# Altium schematic symbol library Minh_Lib.SchLib: 619 symbols (part 2 of 4) (continued)
## EEE-1CA100SR
designator EEE?  Supplier Part Number 1: 5369859
10uF 16 V dc Aluminium Electrolytic Capacitor; VS Series 2000h 4 (Dia.) x 5.4mm; Manufacturer: Panasonic; Manufacturer Part Number: EEE-1CA100SR; Tolerance: 20%; Voltage Rating: 16V; Ripple Current: 28mA; Life (Hours): 2000Hour; Polarity: Polar; Leakage Current: 3uA; Lead Length: 1.8mm; Supplier 1: RSComponents; RoHS: Yes; Category: Aluminum Electrolytic Capacitors; Stock 1: 3; Pricing 1: 5=0.33500, 50=0.19900, 100=0.17500, 500=0.10500, 1000=0.08900, 5=0.24200, 50=0.14400, 100=0.12600, 500=0.07600, 1000=0.06400 (USD); Mount: Surface Mount,PCB; Case/Package: Radial; Number of Pins: 2; Dielectric Material: Aluminium; Contact Plating: Tin; Min Operating Temperature: -40°C; Max Operating Temperature: 85°C; Capacitance: 10uF; Packaging: Tape and Reel; Voltage Rating (DC): 16V; Package Quantity: 2000; Ripple Current (AC): 28mA; Termination: SMD/SMT; Voltage: 16V; Series: S; Construction: Cylindrical; Diameter: 4mm; Length: 5.5mm; Width: 4.3mm; Height: 5.4mm; Height - Seated (Max): 0.213inch; Lead Pitch: 1mm; Radiation Hardening: No; REACH SVHC: No SVHC; Lead Free: Lead Free; RoHS Compliant: Yes; ComponentLink1URL: https://datasheet.ciiva.com/19458/1355487-19458346.pdf?src-supplier=Jameco; ComponentLink1Description: https://datasheet.ciiva.com/19458/1355487-19458346.pdf?src-supplier=Jameco; ComponentLink2URL: https://datasheet.ciiva.com/11784/0900766b8078636e-11784608.pdf?src-supplier=RSComponents; ComponentLink2Description: https://datasheet.ciiva.com/11784/0900766b8078636e-11784608.pdf?src-supplier=RSComponents; ComponentLink3URL: https://datasheet.ciiva.com/14589/70255710-14589897.pdf?src-supplier=Allied+Electronics; ComponentLink3Description: https://datasheet.ciiva.com/14589/70255710-14589897.pdf?src-supplier=Allied+Electronics; ComponentLink4URL: https://datasheet.ciiva.com/14603/70255710-14603768.pdf?src-supplier=Allied+Electronics; ComponentLink4Description: https://datasheet.ciiva.com/14603/70255710-14603768.pdf?src-supplier=Allied+Electronics; ComponentLink5URL: https://datasheet.ciiva.com/14607/70255710-14607567.pdf?src-supplier=Allied+Electronics; ComponentLink5Description: https://datasheet.ciiva.com/14607/70255710-14607567.pdf?src-supplier=Allied+Electronics; ComponentLink6URL: https://datasheet.ciiva.com/43485/aba0000ce2-43485607.pdf?src-supplier=Farnell; ComponentLink6Description: https://datasheet.ciiva.com/43485/aba0000ce2-43485607.pdf?src-supplier=Farnell; ComponentLink7URL: https://datasheet.ciiva.com/46388/aba0000ce2-46388105.pdf?src-supplier=Element14; ComponentLink7Description: https://datasheet.ciiva.com/46388/aba0000ce2-46388105.pdf?src-supplier=Element14; ComponentLink8URL: https://datasheet.ciiva.com/6121/aba0000ce2-6121341.pdf?src-supplier=Farnell; ComponentLink8Description: https://datasheet.ciiva.com/6121/aba0000ce2-6121341.pdf?src-supplier=Farnell; ComponentLink9URL: https://datasheet.ciiva.com/46435/aba0000ce2-46435189.pdf?src-supplier=Element14; ComponentLink9Description: https://datasheet.ciiva.com/46435/aba0000ce2-46435189.pdf?src-supplier=Element14; ComponentLink10URL: https://datasheet.ciiva.com/11681/aba0000ce2-11681100.pdf?src-supplier=Avnet; ComponentLink10Description: https://datasheet.ciiva.com/11681/aba0000ce2-11681100.pdf?src-supplier=Avnet; ComponentLink11URL: https://datasheet.ciiva.com/16508/aba0000ce2-16508470.pdf?src-supplier=Future+Electronics; ComponentLink11Description: https://datasheet.ciiva.com/16508/aba0000ce2-16508470.pdf?src-supplier=Future+Electronics; ComponentLink12URL: https://datasheet.ciiva.com/2983/aba0000ce2-2983908.pdf?src-supplier=Avnet; ComponentLink12Description: https://datasheet.ciiva.com/2983/aba0000ce2-2983908.pdf?src-supplier=Avnet; ComponentLink13URL: https://datasheet.ciiva.com/30164/11aba0000ce2-30164062.pdf?src-supplier=Onlinecomponents.com; ComponentLink13Description: https://datasheet.ciiva.com/30164/11aba0000ce2-30164062.pdf?src-supplier=Onlinecomponents.com; ComponentLink14URL: https://datasheet.ciiva.com/17353/aba0000ce2-17353304.pdf?src-supplier=Avnet+Europe; ComponentLink14Description: https://datasheet.ciiva.com/17353/aba0000ce2-17353304.pdf?src-supplier=Avnet+Europe
footprint CAPACITOR/ALU - SIZE B/SMD - 4X5.4 (CAPACITOR  -  ALUMINIUM - SIZE B / EEEFK - SMD)
pins: 1, 2
text: +

## EEE-1CA101P
designator EEE?  Supplier Part Number 1: 6283986
Cap Aluminum 100uF 16V 20% (8 X 6.2mm) SMD 200mA 2000 hr 85°C T/R; Manufacturer: Panasonic; Manufacturer Part Number: EEE-1CA101P; Life (Hours): 2000Hour; Leakage Current: 3uA; Dissipation Factor: 0.2%; Supplier 1: RSComponents; RoHS: Yes; Category: Aluminum Electrolytic Capacitors; Stock 1: 750; Pricing 1: 5=0.52100, 25=0.37100, 375=0.24700, 1250=0.13900, 5=0.37600, 25=0.26800, 375=0.17800, 1250=0.10000 (USD); Mount: Surface Mount,PCB; Case/Package: Radial; Min Operating Temperature: -40°C; Max Operating Temperature: 85°C; Capacitance: 100uF; Tolerance: 20%; Voltage Rating: 16V; Packaging: Tape and Reel; Ripple Current (AC): 200mA; Ripple Current: 200mA; Voltage Rating (DC): 16V; Package Quantity: 1; Termination: SMD/SMT; Voltage: 16V; Series: S; Construction: Cylindrical; Diameter: 8mm; Length: 6.2mm; Height: 6.2mm; Height - Seated (Max): 0.244inch; Radiation Hardening: No; REACH SVHC: No SVHC; Lead Free: Lead Free; RoHS Compliant: Yes; ComponentLink1URL: https://datasheet.ciiva.com/11780/0900766b808a016a-11780833.pdf?src-supplier=RSComponents; ComponentLink1Description: https://datasheet.ciiva.com/11780/0900766b808a016a-11780833.pdf?src-supplier=RSComponents; ComponentLink2URL: https://datasheet.ciiva.com/24071/aba0000ce2-40801-24071494.pdf?src-supplier=Mouser; ComponentLink2Description: https://datasheet.ciiva.com/24071/aba0000ce2-40801-24071494.pdf?src-supplier=Mouser; ComponentLink3URL: https://datasheet.ciiva.com/14598/70255710-14598917.pdf?src-supplier=Allied+Electronics; ComponentLink3Description: https://datasheet.ciiva.com/14598/70255710-14598917.pdf?src-supplier=Allied+Electronics; ComponentLink4URL: https://datasheet.ciiva.com/11680/aba0000ce2-11680254.pdf?src-supplier=Avnet; ComponentLink4Description: https://datasheet.ciiva.com/11680/aba0000ce2-11680254.pdf?src-supplier=Avnet; ComponentLink5URL: https://datasheet.ciiva.com/16507/aba0000ce2-16507557.pdf?src-supplier=Future+Electronics; ComponentLink5Description: https://datasheet.ciiva.com/16507/aba0000ce2-16507557.pdf?src-supplier=Future+Electronics; ComponentLink6URL: https://datasheet.ciiva.com/2985/aba0000ce2-2985069.pdf?src-supplier=Avnet; ComponentLink6Description: https://datasheet.ciiva.com/2985/aba0000ce2-2985069.pdf?src-supplier=Avnet; ComponentLink7URL: https://datasheet.ciiva.com/30213/11aba0000ce2-30213446.pdf?src-supplier=Onlinecomponents.com; ComponentLink7Description: https://datasheet.ciiva.com/30213/11aba0000ce2-30213446.pdf?src-supplier=Onlinecomponents.com; ComponentLink8URL: https://datasheet.ciiva.com/17353/aba0000ce2-17353306.pdf?src-supplier=Avnet+Europe; ComponentLink8Description: https://datasheet.ciiva.com/17353/aba0000ce2-17353306.pdf?src-supplier=Avnet+Europe
footprint CAPACITOR/ALU - SIZE E/SMD - 8X6.2 (CAPACITOR  -  ALUMINIUM - SIZE E / EEEFK - SMD)
pins: 1, 2
text: +

## EEE-1CA101WP
designator EEE?  Supplier Part Number 1: PCE3880CT-ND
Cap Aluminum 100uF 16V 20% (6.3 X 5.4mm) SMD 70mA 1000 hr 85°C T/R; Manufacturer: Panasonic; Manufacturer Part Number: EEE-1CA101WP; Life (Hours): 1000Hour; Leakage Current: 3uA; Supplier 1: Digi-Key; RoHS: Yes; Category: Aluminum Electrolytic Capacitors; Pricing 1: 1=0.45000, 10=0.31200, 50=0.21860, 100=0.18730, 500=0.14050 (USD); Mount: Surface Mount,PCB; Case/Package: Radial; Contact Plating: Tin; Min Operating Temperature: -40°C; Max Operating Temperature: 85°C; Capacitance: 100uF; Tolerance: 20%; Voltage Rating: 16V; Ripple Current: 70mA; Voltage Rating (DC): 16V; Packaging: Tape and Reel; Package Quantity: 1000; Termination: SMD/SMT; Ripple Current (AC): 70mA; Voltage: 16V; Series: S; Construction: Cylindrical; Diameter: 6.3mm; Length: 5.5mm; Height: 5.4mm; Height - Seated (Max): 0.213inch; Radiation Hardening: No; Lead Free: Lead Free; RoHS Compliant: Yes; REACH SVHC: Unknown; ComponentLink1URL: https://datasheet.ciiva.com/36525/1355583-36525976.pdf?src-supplier=Jameco; ComponentLink1Description: https://datasheet.ciiva.com/36525/1355583-36525976.pdf?src-supplier=Jameco; ComponentLink2URL: https://datasheet.ciiva.com/24022/aba0000ce2-40801-24022853.pdf?src-supplier=Mouser; ComponentLink2Description: https://datasheet.ciiva.com/24022/aba0000ce2-40801-24022853.pdf?src-supplier=Mouser; ComponentLink3URL: https://datasheet.ciiva.com/14600/70255710-14600124.pdf?src-supplier=Allied+Electronics; ComponentLink3Description: https://datasheet.ciiva.com/14600/70255710-14600124.pdf?src-supplier=Allied+Electronics; ComponentLink4URL: https://datasheet.ciiva.com/11680/aba0000ce2-11680765.pdf?src-supplier=Avnet; ComponentLink4Description: https://datasheet.ciiva.com/11680/aba0000ce2-11680765.pdf?src-supplier=Avnet; ComponentLink5URL: https://datasheet.ciiva.com/2983/aba0000ce2-2983909.pdf?src-supplier=Avnet; ComponentLink5Description: https://datasheet.ciiva.com/2983/aba0000ce2-2983909.pdf?src-supplier=Avnet; ComponentLink6URL: https://datasheet.ciiva.com/30194/11aba0000ce2-30194491.pdf?src-supplier=Onlinecomponents.com; ComponentLink6Description: https://datasheet.ciiva.com/30194/11aba0000ce2-30194491.pdf?src-supplier=Onlinecomponents.com; ComponentLink7URL: https://datasheet.ciiva.com/17353/aba0000ce2-17353308.pdf?src-supplier=Avnet+Europe; ComponentLink7Description: https://datasheet.ciiva.com/17353/aba0000ce2-17353308.pdf?src-supplier=Avnet+Europe
footprint CAPACITOR/ALU - SIZE D/SMD - 6.3X5.4 (CAPACITOR  -  ALUMINIUM - SIZE D / EEEFK - SMD)
pins: 1, 2
text: +

## EEE-1CA220SR
designator EEE?  Supplier Part Number 1: 5369865
Aluminum Electrolytic Capacitor, 2000h 5 (Dia) x 5.4mm, 22uF 16 VDC, VS Series; Manufacturer: Panasonic; Manufacturer Part Number: EEE-1CA220SR; Dielectric Material: Aluminium; Voltage Rating: 16V; Ripple Current (AC): 39mA; Tolerance: 20%; Life (Hours): 2000Hour; Leakage Current: 3uA; Lead Length: 2.2mm; Supplier 1: RSComponents; RoHS: Yes; Category: Aluminum Electrolytic Capacitors; Stock 1: 255; Pricing 1: 5=0.34100, 25=0.33800, 375=0.15800, 1250=0.07500, 5=0.24600, 25=0.24400, 375=0.11400, 1250=0.05400 (USD); Mount: Surface Mount,PCB; Case/Package: Radial; Number of Pins: 2; Min Operating Temperature: -40°C; Max Operating Temperature: 85°C; Capacitance: 22uF; Packaging: Tape and Reel; Voltage Rating (DC): 16V; Ripple Current: 39mA; Package Quantity: 1; Termination: SMD/SMT; Voltage: 16V; Series: S; Construction: Cylindrical; Diameter: 5mm; Length: 5.5mm; Width: 5.3mm; Height: 5.4mm; Height - Seated (Max): 0.213inch; Lead Pitch: 1.5mm; Radiation Hardening: No; REACH SVHC: No SVHC; Lead Free: Lead Free; RoHS Compliant: Yes; ComponentLink1URL: https://datasheet.ciiva.com/11779/0900766b8078636e-11779629.pdf?src-supplier=RSComponents; ComponentLink1Description: https://datasheet.ciiva.com/11779/0900766b8078636e-11779629.pdf?src-supplier=RSComponents; ComponentLink2URL: https://datasheet.ciiva.com/24026/aba0000ce2-40801-24026071.pdf?src-supplier=Mouser; ComponentLink2Description: https://datasheet.ciiva.com/24026/aba0000ce2-40801-24026071.pdf?src-supplier=Mouser; ComponentLink3URL: https://datasheet.ciiva.com/14604/70255710-14604313.pdf?src-supplier=Allied+Electronics; ComponentLink3Description: https://datasheet.ciiva.com/14604/70255710-14604313.pdf?src-supplier=Allied+Electronics; ComponentLink4URL: https://datasheet.ciiva.com/14606/70255710-14606093.pdf?src-supplier=Allied+Electronics; ComponentLink4Description: https://datasheet.ciiva.com/14606/70255710-14606093.pdf?src-supplier=Allied+Electronics; ComponentLink5URL: https://datasheet.ciiva.com/43485/aba0000ce2-43485608.pdf?src-supplier=Farnell; ComponentLink5Description: https://datasheet.ciiva.com/43485/aba0000ce2-43485608.pdf?src-supplier=Farnell; ComponentLink6URL: https://datasheet.ciiva.com/6085/aba0000ce2-6085101.pdf?src-supplier=Farnell; ComponentLink6Description: https://datasheet.ciiva.com/6085/aba0000ce2-6085101.pdf?src-supplier=Farnell; ComponentLink7URL: https://datasheet.ciiva.com/2985/aba0000ce2-2985074.pdf?src-supplier=Avnet; ComponentLink7Description: https://datasheet.ciiva.com/2985/aba0000ce2-2985074.pdf?src-supplier=Avnet; ComponentLink8URL: https://datasheet.ciiva.com/16432/aba0000ce2-16432906.pdf?src-supplier=Future+Electronics; ComponentLink8Description: https://datasheet.ciiva.com/16432/aba0000ce2-16432906.pdf?src-supplier=Future+Electronics; ComponentLink9URL: https://datasheet.ciiva.com/2985/aba0000ce2-2985075.pdf?src-supplier=Avnet; ComponentLink9Description: https://datasheet.ciiva.com/2985/aba0000ce2-2985075.pdf?src-supplier=Avnet; ComponentLink10URL: https://datasheet.ciiva.com/30061/11aba0000ce2-30061845.pdf?src-supplier=Onlinecomponents.com; ComponentLink10Description: https://datasheet.ciiva.com/30061/11aba0000ce2-30061845.pdf?src-supplier=Onlinecomponents.com
footprint CAPACITOR/ALU - SIZE C/SMD - 5X5.4 (CAPACITOR  -  ALUMINIUM - SIZE C / EEEFK - SMD)
pins: 1, 2
text: +

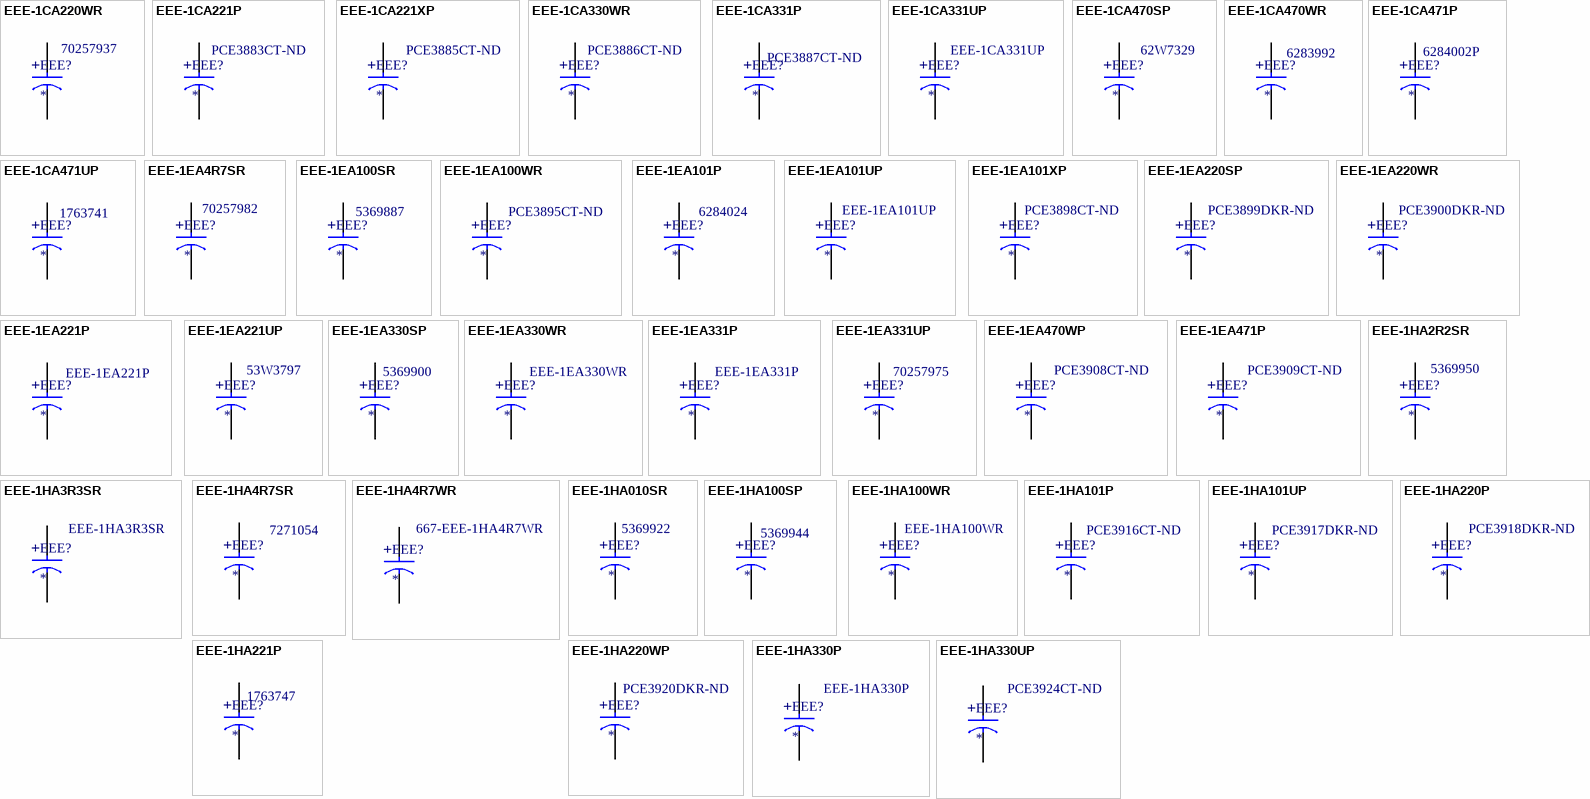
[diagram p8: symbols EEE-1CA220WR to EEE-1HA330UP]

## EEE-1CA220WR
designator EEE?  Supplier Part Number 1: 70257937
Cap Aluminum 22uF 16V 20% (4 X 5.4mm) SMD 28mA 1000h 85 C T/R; Manufacturer: Panasonic; Manufacturer Part Number: EEE-1CA220WR; Polarity: Polar; Life (Hours): 1000Hour; Leakage Current: 3uA; Supplier 1: Allied Electronics; RoHS: Yes; Category: Aluminum Electrolytic Capacitors; Stock 1: 30; Pricing 1: 100=0.14600, 200=0.14300, 500=0.13900, 1000=0.13200, 2500=0.12400, 5000=0.11400, 10000=0.10200 (USD); Mount: Surface Mount,PCB; Case/Package: Radial; Contact Plating: Tin; Min Operating Temperature: -40°C; Max Operating Temperature: 85°C; Capacitance: 22uF; Tolerance: 20%; Voltage Rating: 16V; Packaging: Tape and Reel; Ripple Current (AC): 28mA; Ripple Current: 28mA; Voltage Rating (DC): 16V; Package Quantity: 2000; Termination: SMD/SMT; Voltage: 16V; Series: S; Construction: Cylindrical; Diameter: 4mm; Length: 5.5mm; Height: 5.4mm; Height - Seated (Max): 0.213inch; Radiation Hardening: No; REACH SVHC: Unknown; Lead Free: Lead Free; RoHS Compliant: Yes; ComponentLink1URL: https://datasheet.ciiva.com/24023/aba0000ce2-40801-24023653.pdf?src-supplier=Mouser; ComponentLink1Description: https://datasheet.ciiva.com/24023/aba0000ce2-40801-24023653.pdf?src-supplier=Mouser; ComponentLink2URL: https://datasheet.ciiva.com/14592/70255710-14592571.pdf?src-supplier=Allied+Electronics; ComponentLink2Description: https://datasheet.ciiva.com/14592/70255710-14592571.pdf?src-supplier=Allied+Electronics; ComponentLink3URL: https://datasheet.ciiva.com/11673/aba0000ce2-11673883.pdf?src-supplier=Avnet; ComponentLink3Description: https://datasheet.ciiva.com/11673/aba0000ce2-11673883.pdf?src-supplier=Avnet; ComponentLink4URL: https://datasheet.ciiva.com/2983/aba0000ce2-2983910.pdf?src-supplier=Avnet; ComponentLink4Description: https://datasheet.ciiva.com/2983/aba0000ce2-2983910.pdf?src-supplier=Avnet; ComponentLink5URL: https://datasheet.ciiva.com/30227/11aba0000ce2-30227839.pdf?src-supplier=Onlinecomponents.com; ComponentLink5Description: https://datasheet.ciiva.com/30227/11aba0000ce2-30227839.pdf?src-supplier=Onlinecomponents.com; ComponentLink6URL: https://datasheet.ciiva.com/17536/aba0000ce2-17536751.pdf?src-supplier=Avnet+Europe; ComponentLink6Description: https://datasheet.ciiva.com/17536/aba0000ce2-17536751.pdf?src-supplier=Avnet+Europe
footprint CAPACITOR/ALU - SIZE B/SMD - 4X5.4 (CAPACITOR  -  ALUMINIUM - SIZE B / EEEFK - SMD)
pins: 1, 2
text: +

## EEE-1CA221P
designator EEE?  Supplier Part Number 1: PCE3883CT-ND
Cap Aluminum 220uF 16V 20% (8 X 10.2mm) SMD 280mA 2000h 85°C T/R; Manufacturer: Panasonic; Manufacturer Part Number: EEE-1CA221P; Life (Hours): 2000Hour; Leakage Current: 3uA; Supplier 1: Digi-Key; RoHS: Yes; Category: Aluminum Electrolytic Capacitors; Stock 1: 191; Pricing 1: 1=0.65000, 10=0.46000, 50=0.34760, 100=0.30270 (USD); Mount: Surface Mount,PCB; Case/Package: Radial; Contact Plating: Tin; Min Operating Temperature: -40°C; Max Operating Temperature: 85°C; Capacitance: 220uF; Tolerance: 20%; Ripple Current: 280mA; Packaging: Tape and Reel; Voltage Rating: 16V; Ripple Current (AC): 280mA; Voltage Rating (DC): 16V; Package Quantity: 1; Termination: SMD/SMT; Voltage: 16V; Series: S; Construction: Cylindrical; Diameter: 8mm; Length: 10.5mm; Height: 10.2mm; Height - Seated (Max): 0.402inch; Radiation Hardening: No; REACH SVHC: No SVHC; Lead Free: Lead Free; RoHS Compliant: Yes; ComponentLink1URL: https://datasheet.ciiva.com/24070/aba0000ce2-40801-24070414.pdf?src-supplier=Mouser; ComponentLink1Description: https://datasheet.ciiva.com/24070/aba0000ce2-40801-24070414.pdf?src-supplier=Mouser; ComponentLink2URL: https://datasheet.ciiva.com/14593/70255710-14593371.pdf?src-supplier=Allied+Electronics; ComponentLink2Description: https://datasheet.ciiva.com/14593/70255710-14593371.pdf?src-supplier=Allied+Electronics; ComponentLink3URL: https://datasheet.ciiva.com/2985/aba0000ce2-2985078.pdf?src-supplier=Avnet; ComponentLink3Description: https://datasheet.ciiva.com/2985/aba0000ce2-2985078.pdf?src-supplier=Avnet; ComponentLink4URL: https://datasheet.ciiva.com/30265/11aba0000ce2-30265224.pdf?src-supplier=Onlinecomponents.com; ComponentLink4Description: https://datasheet.ciiva.com/30265/11aba0000ce2-30265224.pdf?src-supplier=Onlinecomponents.com; ComponentLink5URL: https://datasheet.ciiva.com/15165/getdatasheetpartid-33945-15165629.pdf?src-supplier=Verical; ComponentLink5Description: https://datasheet.ciiva.com/15165/getdatasheetpartid-33945-15165629.pdf?src-supplier=Verical
footprint CAPACITOR/ALU - SIZE F/SMD - 8X10.2 (CAPACITOR  -  ALUMINIUM - SIZE F / EEEFK - SMD)
pins: 1, 2
text: +

## EEE-1CA221XP
designator EEE?  Supplier Part Number 1: PCE3885CT-ND
Cap Aluminum 220uF 16V 20% (6.3 X 7.7mm) SMD 162mA 2000h 85°C T/R; Manufacturer: Panasonic; Manufacturer Part Number: EEE-1CA221XP; Dielectric Material: Aluminium; Polarity: Polar; Life (Hours): 2000Hour; Leakage Current: 35.2uA; Supplier 1: Digi-Key; RoHS: Yes; Category: Aluminum Electrolytic Capacitors; Pricing 1: 1=0.52000, 10=0.36100, 50=0.25240, 100=0.21630 (USD); Mount: Surface Mount,PCB; Case/Package: Radial; Contact Plating: Tin; Min Operating Temperature: -40°C; Max Operating Temperature: 85°C; Capacitance: 220uF; Tolerance: 20%; Voltage Rating: 16V; Ripple Current: 162mA; Voltage Rating (DC): 16V; Packaging: Tape and Reel; Package Quantity: 900; Ripple Current (AC): 162mA; Termination: SMD/SMT; Voltage: 16V; Series: S; Construction: Cylindrical; Diameter: 6.3mm; Length: 8mm; Height: 7.7mm; Height - Seated (Max): 0.303inch; Radiation Hardening: No; REACH SVHC: No SVHC; Lead Free: Lead Free; RoHS Compliant: Yes; ComponentLink1URL: https://datasheet.ciiva.com/43470/aba0000ce2-43470637.pdf?src-supplier=Farnell; ComponentLink1Description: https://datasheet.ciiva.com/43470/aba0000ce2-43470637.pdf?src-supplier=Farnell; ComponentLink2URL: https://datasheet.ciiva.com/46378/aba0000ce2-46378312.pdf?src-supplier=Element14; ComponentLink2Description: https://datasheet.ciiva.com/46378/aba0000ce2-46378312.pdf?src-supplier=Element14; ComponentLink3URL: https://datasheet.ciiva.com/31414/aba0000ce2-31414645.pdf?src-supplier=Farnell; ComponentLink3Description: https://datasheet.ciiva.com/31414/aba0000ce2-31414645.pdf?src-supplier=Farnell; ComponentLink4URL: https://datasheet.ciiva.com/46374/aba0000ce2-46374334.pdf?src-supplier=Element14; ComponentLink4Description: https://datasheet.ciiva.com/46374/aba0000ce2-46374334.pdf?src-supplier=Element14; ComponentLink5URL: https://datasheet.ciiva.com/14603/70255710-14603806.pdf?src-supplier=Allied+Electronics; ComponentLink5Description: https://datasheet.ciiva.com/14603/70255710-14603806.pdf?src-supplier=Allied+Electronics; ComponentLink6URL: https://datasheet.ciiva.com/14597/70255710-14597237.pdf?src-supplier=Allied+Electronics; ComponentLink6Description: https://datasheet.ciiva.com/14597/70255710-14597237.pdf?src-supplier=Allied+Electronics; ComponentLink7URL: https://datasheet.ciiva.com/11673/aba0000ce2-11673884.pdf?src-supplier=Avnet; ComponentLink7Description: https://datasheet.ciiva.com/11673/aba0000ce2-11673884.pdf?src-supplier=Avnet; ComponentLink8URL: https://datasheet.ciiva.com/16200/aba0000ce2-16200885.pdf?src-supplier=Future+Electronics; ComponentLink8Description: https://datasheet.ciiva.com/16200/aba0000ce2-16200885.pdf?src-supplier=Future+Electronics; ComponentLink9URL: https://datasheet.ciiva.com/16539/aba0000ce2-16539935.pdf?src-supplier=Avnet+Asia; ComponentLink9Description: https://datasheet.ciiva.com/16539/aba0000ce2-16539935.pdf?src-supplier=Avnet+Asia
footprint CAPACITOR/ALU - SIZE D8/SMD - 6.3X7.7 (CAPACITOR  -  ALUMINIUM - SIZE D8 / EEEFK - SMD)
pins: 1, 2
text: +

## EEE-1CA330WR
designator EEE?  Supplier Part Number 1: PCE3886CT-ND
Cap Aluminum 33uF 16V 20% (5 X 5.4mm) SMD 35mA 1000 hr 85°C T/R; Manufacturer: Panasonic; Manufacturer Part Number: EEE-1CA330WR; Life (Hours): 1000Hour; Supplier 1: Digi-Key; RoHS: Yes; Category: Aluminum Electrolytic Capacitors; Stock 1: 8; Pricing 1: 1=0.35000, 10=0.24400, 50=0.17060, 100=0.14630, 500=0.10972 (USD); Mount: Surface Mount,PCB; Case/Package: Radial; Min Operating Temperature: -40°C; Max Operating Temperature: 85°C; Capacitance: 33uF; Voltage Rating: 16V; Tolerance: 20%; Ripple Current: 35mA; Packaging: Tape and Reel; Package Quantity: 1; Ripple Current (AC): 35mA; Voltage Rating (DC): 16V; Termination: SMD/SMT; Series: S; Construction: Cylindrical; Diameter: 5mm; Length: 5.5mm; Height: 5.4mm; Height - Seated (Max): 0.213inch; Radiation Hardening: No; REACH SVHC: No SVHC; Lead Free: Lead Free; RoHS Compliant: Yes; ComponentLink1URL: https://datasheet.ciiva.com/16388/aba0000ce2-16388678.pdf?src-supplier=Future+Electronics; ComponentLink1Description: https://datasheet.ciiva.com/16388/aba0000ce2-16388678.pdf?src-supplier=Future+Electronics; ComponentLink2URL: https://datasheet.ciiva.com/31414/aba0000ce2-31414646.pdf?src-supplier=Farnell; ComponentLink2Description: https://datasheet.ciiva.com/31414/aba0000ce2-31414646.pdf?src-supplier=Farnell; ComponentLink3URL: https://datasheet.ciiva.com/46378/aba0000ce2-46378311.pdf?src-supplier=Element14; ComponentLink3Description: https://datasheet.ciiva.com/46378/aba0000ce2-46378311.pdf?src-supplier=Element14; ComponentLink4URL: https://datasheet.ciiva.com/30129/11aba0000ce2-30129770.pdf?src-supplier=Onlinecomponents.com; ComponentLink4Description: https://datasheet.ciiva.com/30129/11aba0000ce2-30129770.pdf?src-supplier=Onlinecomponents.com; ComponentLink5URL: https://datasheet.ciiva.com/14596/70255710-14596699.pdf?src-supplier=Allied+Electronics; ComponentLink5Description: https://datasheet.ciiva.com/14596/70255710-14596699.pdf?src-supplier=Allied+Electronics; ComponentLink6URL: https://datasheet.ciiva.com/46374/aba0000ce2-46374333.pdf?src-supplier=Element14; ComponentLink6Description: https://datasheet.ciiva.com/46374/aba0000ce2-46374333.pdf?src-supplier=Element14; ComponentLink7URL: https://datasheet.ciiva.com/2985/aba0000ce2-2985086.pdf?src-supplier=Avnet; ComponentLink7Description: https://datasheet.ciiva.com/2985/aba0000ce2-2985086.pdf?src-supplier=Avnet; ComponentLink8URL: https://datasheet.ciiva.com/24027/aba0000ce2-40801-24027199.pdf?src-supplier=Mouser; ComponentLink8Description: https://datasheet.ciiva.com/24027/aba0000ce2-40801-24027199.pdf?src-supplier=Mouser; ComponentLink9URL: https://datasheet.ciiva.com/17536/aba0000ce2-17536604.pdf?src-supplier=Avnet+Europe; ComponentLink9Description: https://datasheet.ciiva.com/17536/aba0000ce2-17536604.pdf?src-supplier=Avnet+Europe; ComponentLink10URL: https://datasheet.ciiva.com/14602/70255710-14602350.pdf?src-supplier=Allied+Electronics; ComponentLink10Description: https://datasheet.ciiva.com/14602/70255710-14602350.pdf?src-supplier=Allied+Electronics; ComponentLink11URL: https://datasheet.ciiva.com/43470/aba0000ce2-43470638.pdf?src-supplier=Farnell; ComponentLink11Description: https://datasheet.ciiva.com/43470/aba0000ce2-43470638.pdf?src-supplier=Farnell
footprint CAPACITOR/ALU - SIZE C/SMD - 5X5.4 (CAPACITOR  -  ALUMINIUM - SIZE C / EEEFK - SMD)
pins: 1, 2
text: +

## EEE-1CA331P
designator EEE?  Supplier Part Number 1: PCE3887CT-ND
Cap Aluminum 330uF 16V 20% (10 X 10.2mm) SMD 380mA 2000 hr 85°C T/R; Manufacturer: Panasonic; Manufacturer Part Number: EEE-1CA331P; Life (Hours): 2000Hour; Leakage Current: 3uA; Supplier 1: Digi-Key; RoHS: Yes; Category: Aluminum Electrolytic Capacitors; Pricing 1: 1=0.76000, 10=0.53800, 50=0.40720, 100=0.35460 (USD); Mount: Surface Mount; Case/Package: Radial; Min Operating Temperature: -40°C; Max Operating Temperature: 85°C; Packaging: Tape and Reel; Capacitance: 330uF; Tolerance: 20%; Ripple Current: 380mA; Voltage Rating: 16V; Voltage Rating (DC): 16V; Package Quantity: 500; Termination: SMD/SMT; Series: S; Construction: Cylindrical; Ripple Current (AC): 380mA; Voltage: 16V; Diameter: 10mm; Length: 10.5mm; Height: 10.2mm; Height - Seated (Max): 0.402inch; Radiation Hardening: No; Lead Free: Lead Free; RoHS Compliant: Yes; REACH SVHC: Unknown; ComponentLink1URL: https://datasheet.ciiva.com/2985/aba0000ce2-2985088.pdf?src-supplier=Avnet; ComponentLink1Description: https://datasheet.ciiva.com/2985/aba0000ce2-2985088.pdf?src-supplier=Avnet; ComponentLink2URL: https://datasheet.ciiva.com/14610/70255710-14610587.pdf?src-supplier=Allied+Electronics; ComponentLink2Description: https://datasheet.ciiva.com/14610/70255710-14610587.pdf?src-supplier=Allied+Electronics; ComponentLink3URL: https://datasheet.ciiva.com/17534/aba0000ce2-17534507.pdf?src-supplier=Avnet+Europe; ComponentLink3Description: https://datasheet.ciiva.com/17534/aba0000ce2-17534507.pdf?src-supplier=Avnet+Europe; ComponentLink4URL: https://datasheet.ciiva.com/24069/aba0000ce2-40801-24069277.pdf?src-supplier=Mouser; ComponentLink4Description: https://datasheet.ciiva.com/24069/aba0000ce2-40801-24069277.pdf?src-supplier=Mouser; ComponentLink5URL: https://datasheet.ciiva.com/14593/70255710-14593503.pdf?src-supplier=Allied+Electronics; ComponentLink5Description: https://datasheet.ciiva.com/14593/70255710-14593503.pdf?src-supplier=Allied+Electronics
footprint CAPACITOR/ALU - SIZE G/SMD - 10X10.2 (CAPACITOR  -  ALUMINIUM - SIZE G / EEEFK - SMD)
pins: 1, 2
text: +

## EEE-1CA331UP
designator EEE?  Supplier Part Number 1: EEE-1CA331UP
Cap Aluminum 330uF 16V 20% (8 X 10.2mm) SMD 320mA 2000 hr 85°C T/R; Manufacturer: Panasonic; Dielectric Material: Aluminium; Life (Hours): 2000Hour; Leakage Current: 52.8uA; Supplier 1: Arrow Electronics; Manufacturer Part Number: EEE-1CA331UP; RoHS: Yes; Category: Aluminum Electrolytic Capacitors; Stock 1: 9; Pricing 1: 1=0.56020 (USD); Mount: Surface Mount,PCB; Case/Package: Radial; Contact Plating: Tin; Min Operating Temperature: -40°C; Max Operating Temperature: 85°C; Capacitance: 330uF; Voltage Rating: 16V; Tolerance: 20%; Ripple Current: 320mA; Packaging: Tape and Reel; Package Quantity: 1; Ripple Current (AC): 320mA; Voltage Rating (DC): 16V; Termination: SMD/SMT; Voltage: 16V; Series: S; Construction: Cylindrical; Diameter: 8mm; Length: 10.5mm; Height: 10.2mm; Height - Seated (Max): 0.402inch; Radiation Hardening: No; REACH SVHC: No SVHC; Lead Free: Lead Free; RoHS Compliant: Yes; ComponentLink1URL: https://datasheet.ciiva.com/43470/aba0000ce2-43470639.pdf?src-supplier=Farnell; ComponentLink1Description: https://datasheet.ciiva.com/43470/aba0000ce2-43470639.pdf?src-supplier=Farnell; ComponentLink2URL: https://datasheet.ciiva.com/46378/aba0000ce2-46378310.pdf?src-supplier=Element14; ComponentLink2Description: https://datasheet.ciiva.com/46378/aba0000ce2-46378310.pdf?src-supplier=Element14; ComponentLink3URL: https://datasheet.ciiva.com/31414/aba0000ce2-31414647.pdf?src-supplier=Farnell; ComponentLink3Description: https://datasheet.ciiva.com/31414/aba0000ce2-31414647.pdf?src-supplier=Farnell; ComponentLink4URL: https://datasheet.ciiva.com/46374/aba0000ce2-46374332.pdf?src-supplier=Element14; ComponentLink4Description: https://datasheet.ciiva.com/46374/aba0000ce2-46374332.pdf?src-supplier=Element14; ComponentLink5URL: https://datasheet.ciiva.com/14610/70255710-14610213.pdf?src-supplier=Allied+Electronics; ComponentLink5Description: https://datasheet.ciiva.com/14610/70255710-14610213.pdf?src-supplier=Allied+Electronics; ComponentLink6URL: https://datasheet.ciiva.com/2985/aba0000ce2-2985089.pdf?src-supplier=Avnet; ComponentLink6Description: https://datasheet.ciiva.com/2985/aba0000ce2-2985089.pdf?src-supplier=Avnet; ComponentLink7URL: https://datasheet.ciiva.com/16388/aba0000ce2-16388680.pdf?src-supplier=Future+Electronics; ComponentLink7Description: https://datasheet.ciiva.com/16388/aba0000ce2-16388680.pdf?src-supplier=Future+Electronics; ComponentLink8URL: https://datasheet.ciiva.com/15166/getdatasheetpartid-169248-15166139.pdf?src-supplier=Verical; ComponentLink8Description: https://datasheet.ciiva.com/15166/getdatasheetpartid-169248-15166139.pdf?src-supplier=Verical; ComponentLink9URL: https://datasheet.ciiva.com/30112/11aba0000ce2-30112718.pdf?src-supplier=Onlinecomponents.com; ComponentLink9Description: https://datasheet.ciiva.com/30112/11aba0000ce2-30112718.pdf?src-supplier=Onlinecomponents.com; ComponentLink10URL: https://datasheet.ciiva.com/17534/aba0000ce2-17534731.pdf?src-supplier=Avnet+Europe; ComponentLink10Description: https://datasheet.ciiva.com/17534/aba0000ce2-17534731.pdf?src-supplier=Avnet+Europe
footprint CAPACITOR/ALU - SIZE F/SMD - 8X10.2 (CAPACITOR  -  ALUMINIUM - SIZE F / EEEFK - SMD)
pins: 1, 2
text: +

## EEE-1CA470SP
designator EEE?  Supplier Part Number 1: 62W7329
Cap Aluminum 47uF 16V 20% (6.3 X 5.4mm) SMD 70mA 2000 hr 85°C T/R; Manufacturer: Panasonic; Manufacturer Part Number: EEE-1CA470SP; Dielectric Material: Aluminium; Life (Hours): 2000Hour; Polarity: Polar; Supplier 1: Newark; RoHS: Yes; Category: Aluminum Electrolytic Capacitors; Stock 1: 3854; Pricing 1: 1=0.52300, 10=0.36500, 25=0.31600, 50=0.26800, 100=0.21900 (USD); Mount: Surface Mount; Case/Package: Radial; Min Operating Temperature: -40°C; Max Operating Temperature: 85°C; Capacitance: 47uF; Tolerance: 20%; Voltage Rating: 16V; Packaging: Tape and Reel; Series: S; Height - Seated (Max): 0.213inch; Ratings: AEC-Q200; Lead Free: Lead Free; RoHS Compliant: Yes; ComponentLink1URL: https://datasheet.ciiva.com/19458/1355727-19458344.pdf?src-supplier=Jameco; ComponentLink1Description: https://datasheet.ciiva.com/19458/1355727-19458344.pdf?src-supplier=Jameco; ComponentLink2URL: https://datasheet.ciiva.com/11778/0900766b8078636e-11778913.pdf?src-supplier=RSComponents; ComponentLink2Description: https://datasheet.ciiva.com/11778/0900766b8078636e-11778913.pdf?src-supplier=RSComponents; ComponentLink3URL: https://datasheet.ciiva.com/24071/aba0000ce2-40801-24071845.pdf?src-supplier=Mouser; ComponentLink3Description: https://datasheet.ciiva.com/24071/aba0000ce2-40801-24071845.pdf?src-supplier=Mouser; ComponentLink4URL: https://datasheet.ciiva.com/14607/70255710-14607830.pdf?src-supplier=Allied+Electronics; ComponentLink4Description: https://datasheet.ciiva.com/14607/70255710-14607830.pdf?src-supplier=Allied+Electronics; ComponentLink5URL: https://datasheet.ciiva.com/14604/70255710-14604671.pdf?src-supplier=Allied+Electronics; ComponentLink5Description: https://datasheet.ciiva.com/14604/70255710-14604671.pdf?src-supplier=Allied+Electronics; ComponentLink6URL: https://datasheet.ciiva.com/43485/aba0000ce2-43485609.pdf?src-supplier=Farnell; ComponentLink6Description: https://datasheet.ciiva.com/43485/aba0000ce2-43485609.pdf?src-supplier=Farnell; ComponentLink7URL: https://datasheet.ciiva.com/2983/aba0000ce2-2983912.pdf?src-supplier=Avnet; ComponentLink7Description: https://datasheet.ciiva.com/2983/aba0000ce2-2983912.pdf?src-supplier=Avnet; ComponentLink8URL: https://datasheet.ciiva.com/3773/41677465s8887859n1386-3773738.pdf?src-supplier=Arrow+Electronics; ComponentLink8Description: https://datasheet.ciiva.com/3773/41677465s8887859n1386-3773738.pdf?src-supplier=Arrow+Electronics; ComponentLink9URL: https://datasheet.ciiva.com/16432/aba0000ce2-16432907.pdf?src-supplier=Future+Electronics; ComponentLink9Description: https://datasheet.ciiva.com/16432/aba0000ce2-16432907.pdf?src-supplier=Future+Electronics; ComponentLink10URL: https://datasheet.ciiva.com/15166/getdatasheetpartid-178440-15166198.pdf?src-supplier=Verical; ComponentLink10Description: https://datasheet.ciiva.com/15166/getdatasheetpartid-178440-15166198.pdf?src-supplier=Verical; ComponentLink11URL: https://datasheet.ciiva.com/2985/aba0000ce2-2985090.pdf?src-supplier=Avnet; ComponentLink11Description: https://datasheet.ciiva.com/2985/aba0000ce2-2985090.pdf?src-supplier=Avnet; ComponentLink12URL: https://datasheet.ciiva.com/30228/11aba0000ce2-30228781.pdf?src-supplier=Onlinecomponents.com; ComponentLink12Description: https://datasheet.ciiva.com/30228/11aba0000ce2-30228781.pdf?src-supplier=Onlinecomponents.com
footprint CAPACITOR/ALU - SIZE D/SMD - 6.3X5.4 (CAPACITOR  -  ALUMINIUM - SIZE D / EEEFK - SMD)
pins: 1, 2
text: +

## EEE-1CA470WR
designator EEE?  Supplier Part Number 1: 6283992
Capacitor; Alum Electrolytic; Cap 47 uF; Tol 20%; Vol-Rtg 16 VDC; SMT; 5x5.5; Tape&Reel; Manufacturer: Panasonic; Manufacturer Part Number: EEE-1CA470WR; Capacitance: 47uF; Voltage Rating: 16V; Ripple Current (AC): 39mA; Life (Hours): 1000Hour; Leakage Current: 3uA; Supplier 1: RSComponents; RoHS: Yes; Category: Aluminum Electrolytic Capacitors; Stock 1: 335; Pricing 1: 5=0.34900, 10=0.24100, 50=0.22700, 250=0.14700, 500=0.10800, 5=0.25200, 10=0.17400, 50=0.16400, 250=0.10600, 500=0.07800 (USD); Mount: Surface Mount,PCB; Case/Package: Radial; Contact Plating: Tin; Min Operating Temperature: -40°C; Max Operating Temperature: 85°C; Tolerance: 20%; Packaging: Tape and Reel; Ripple Current: 39mA; Voltage Rating (DC): 16V; Package Quantity: 1; Termination: SMD/SMT; Voltage: 16V; Series: S; Construction: Cylindrical; Diameter: 5mm; Length: 5.5mm; Height: 5.4mm; Height - Seated (Max): 0.213inch; Radiation Hardening: No; REACH SVHC: No SVHC; Lead Free: Lead Free; RoHS Compliant: Yes; ComponentLink1URL: https://datasheet.ciiva.com/25613/0900766b808a016a-25613582.pdf?src-supplier=RSComponents; ComponentLink1Description: https://datasheet.ciiva.com/25613/0900766b808a016a-25613582.pdf?src-supplier=RSComponents; ComponentLink2URL: https://datasheet.ciiva.com/31414/aba0000ce2-31414650.pdf?src-supplier=Farnell; ComponentLink2Description: https://datasheet.ciiva.com/31414/aba0000ce2-31414650.pdf?src-supplier=Farnell; ComponentLink3URL: https://datasheet.ciiva.com/46374/aba0000ce2-46374329.pdf?src-supplier=Element14; ComponentLink3Description: https://datasheet.ciiva.com/46374/aba0000ce2-46374329.pdf?src-supplier=Element14; ComponentLink4URL: https://datasheet.ciiva.com/24023/aba0000ce2-40801-24023132.pdf?src-supplier=Mouser; ComponentLink4Description: https://datasheet.ciiva.com/24023/aba0000ce2-40801-24023132.pdf?src-supplier=Mouser; ComponentLink5URL: https://datasheet.ciiva.com/14599/70255710-14599798.pdf?src-supplier=Allied+Electronics; ComponentLink5Description: https://datasheet.ciiva.com/14599/70255710-14599798.pdf?src-supplier=Allied+Electronics; ComponentLink6URL: https://datasheet.ciiva.com/3773/41677466s8110047n1386-3773781.pdf?src-supplier=Arrow+Electronics; ComponentLink6Description: https://datasheet.ciiva.com/3773/41677466s8110047n1386-3773781.pdf?src-supplier=Arrow+Electronics; ComponentLink7URL: https://datasheet.ciiva.com/16449/aba0000ce2-16449529.pdf?src-supplier=Future+Electronics; ComponentLink7Description: https://datasheet.ciiva.com/16449/aba0000ce2-16449529.pdf?src-supplier=Future+Electronics; ComponentLink8URL: https://datasheet.ciiva.com/30145/11aba0000ce2-30145526.pdf?src-supplier=Onlinecomponents.com; ComponentLink8Description: https://datasheet.ciiva.com/30145/11aba0000ce2-30145526.pdf?src-supplier=Onlinecomponents.com; ComponentLink9URL: https://datasheet.ciiva.com/17536/aba0000ce2-17536543.pdf?src-supplier=Avnet+Europe; ComponentLink9Description: https://datasheet.ciiva.com/17536/aba0000ce2-17536543.pdf?src-supplier=Avnet+Europe; ComponentLink10URL: https://datasheet.ciiva.com/16544/aba0000ce2-16544607.pdf?src-supplier=Avnet+Asia; ComponentLink10Description: https://datasheet.ciiva.com/16544/aba0000ce2-16544607.pdf?src-supplier=Avnet+Asia
footprint CAPACITOR/ALU - SIZE C/SMD - 5X5.4 (CAPACITOR  -  ALUMINIUM - SIZE C / EEEFK - SMD)
pins: 1, 2
text: +

## EEE-1CA471P
designator EEE?  Supplier Part Number 1: 6284002P
Aluminum Electrolytic Capacitor, 470UF, 16V, 20%, SMD, Full Reel; Manufacturer: Panasonic; Manufacturer Part Number: EEE-1CA471P; Ripple Current: 420mA; Life (Hours): 2000Hour; Leakage Current: 3uA; Supplier 1: RSComponents; RoHS: Yes; Category: Aluminum Electrolytic Capacitors; Stock 1: 1; Pricing 1: 5=0.75600, 50=0.52600, 100=0.35700, 500=0.22700, 1000=0.22200 (USD); Mount: Surface Mount,PCB; Case/Package: Radial; Contact Plating: Tin; Min Operating Temperature: -40°C; Max Operating Temperature: 85°C; Capacitance: 470uF; Tolerance: 20%; Voltage Rating (DC): 16V; Packaging: Tape and Reel; Voltage Rating: 16V; Package Quantity: 1; Termination: SMD/SMT; Ripple Current (AC): 420mA; Voltage: 16V; Series: S; Construction: Cylindrical; Diameter: 10mm; Length: 10.5mm; Height: 10.2mm; Height - Seated (Max): 0.402inch; Radiation Hardening: No; Lead Free: Lead Free; RoHS Compliant: Yes; REACH SVHC: No SVHC; ComponentLink1URL: https://datasheet.ciiva.com/11780/0900766b808a016a-11780049.pdf?src-supplier=RSComponents; ComponentLink1Description: https://datasheet.ciiva.com/11780/0900766b808a016a-11780049.pdf?src-supplier=RSComponents; ComponentLink2URL: https://datasheet.ciiva.com/31414/aba0000ce2-31414652.pdf?src-supplier=Farnell; ComponentLink2Description: https://datasheet.ciiva.com/31414/aba0000ce2-31414652.pdf?src-supplier=Farnell; ComponentLink3URL: https://datasheet.ciiva.com/46374/aba0000ce2-46374327.pdf?src-supplier=Element14; ComponentLink3Description: https://datasheet.ciiva.com/46374/aba0000ce2-46374327.pdf?src-supplier=Element14; ComponentLink4URL: https://datasheet.ciiva.com/24240/aba0000ce2-40801-24240326.pdf?src-supplier=Mouser; ComponentLink4Description: https://datasheet.ciiva.com/24240/aba0000ce2-40801-24240326.pdf?src-supplier=Mouser; ComponentLink5URL: https://datasheet.ciiva.com/14603/70255710-14603611.pdf?src-supplier=Allied+Electronics; ComponentLink5Description: https://datasheet.ciiva.com/14603/70255710-14603611.pdf?src-supplier=Allied+Electronics; ComponentLink6URL: https://datasheet.ciiva.com/2985/aba0000ce2-2985095.pdf?src-supplier=Avnet; ComponentLink6Description: https://datasheet.ciiva.com/2985/aba0000ce2-2985095.pdf?src-supplier=Avnet; ComponentLink7URL: https://datasheet.ciiva.com/2985/aba0000ce2-2985096.pdf?src-supplier=Avnet; ComponentLink7Description: https://datasheet.ciiva.com/2985/aba0000ce2-2985096.pdf?src-supplier=Avnet; ComponentLink8URL: https://datasheet.ciiva.com/17353/aba0000ce2-17353317.pdf?src-supplier=Avnet+Europe; ComponentLink8Description: https://datasheet.ciiva.com/17353/aba0000ce2-17353317.pdf?src-supplier=Avnet+Europe
footprint CAPACITOR/ALU - SIZE G/SMD - 10X10.2 (CAPACITOR  -  ALUMINIUM - SIZE G / EEEFK - SMD)
pins: 1, 2
text: +

## EEE-1CA471UP
designator EEE?  Supplier Part Number 1: 1763741
Cap Aluminum 470uF 16V 20% (8 X 10.2mm) SMD 350mA 2000h 85 C T/R; Manufacturer: Panasonic; Manufacturer Part Number: EEE-1CA471UP; Life (Hours): 2000Hour; Supplier 1: RSComponents; RoHS: Yes; Category: Aluminum Electrolytic Capacitors; Stock 1: 480; Pricing 1: 500=0.27300, 1500=0.25900, 500=0.19700, 1500=0.18700 (USD); Mount: Surface Mount,PCB; Case/Package: Radial; Contact Plating: Tin; Min Operating Temperature: -40°C; Max Operating Temperature: 85°C; Packaging: Tape and Reel; Capacitance: 470uF; Voltage Rating: 16V; Ripple Current (AC): 350mA; Tolerance: 20%; Ripple Current: 350mA; Voltage Rating (DC): 16V; Package Quantity: 500; Termination: SMD/SMT; Series: S; Construction: Cylindrical; Diameter: 8mm; Length: 10.5mm; Height: 10.2mm; Height - Seated (Max): 0.402inch; Radiation Hardening: No; REACH SVHC: Unknown; Lead Free: Lead Free; RoHS Compliant: Yes; ComponentLink1URL: https://datasheet.ciiva.com/24028/aba0000ce2-40801-24028261.pdf?src-supplier=Mouser; ComponentLink1Description: https://datasheet.ciiva.com/24028/aba0000ce2-40801-24028261.pdf?src-supplier=Mouser; ComponentLink2URL: https://datasheet.ciiva.com/14600/70255710-14600741.pdf?src-supplier=Allied+Electronics; ComponentLink2Description: https://datasheet.ciiva.com/14600/70255710-14600741.pdf?src-supplier=Allied+Electronics; ComponentLink3URL: https://datasheet.ciiva.com/14602/70255710-14602456.pdf?src-supplier=Allied+Electronics; ComponentLink3Description: https://datasheet.ciiva.com/14602/70255710-14602456.pdf?src-supplier=Allied+Electronics; ComponentLink4URL: https://datasheet.ciiva.com/2983/aba0000ce2-2983914.pdf?src-supplier=Avnet; ComponentLink4Description: https://datasheet.ciiva.com/2983/aba0000ce2-2983914.pdf?src-supplier=Avnet; ComponentLink5URL: https://datasheet.ciiva.com/2985/aba0000ce2-2985099.pdf?src-supplier=Avnet; ComponentLink5Description: https://datasheet.ciiva.com/2985/aba0000ce2-2985099.pdf?src-supplier=Avnet; ComponentLink6URL: https://datasheet.ciiva.com/30071/11aba0000ce2-30071834.pdf?src-supplier=Onlinecomponents.com; ComponentLink6Description: https://datasheet.ciiva.com/30071/11aba0000ce2-30071834.pdf?src-supplier=Onlinecomponents.com; ComponentLink7URL: https://datasheet.ciiva.com/17534/aba0000ce2-17534539.pdf?src-supplier=Avnet+Europe; ComponentLink7Description: https://datasheet.ciiva.com/17534/aba0000ce2-17534539.pdf?src-supplier=Avnet+Europe
footprint CAPACITOR/ALU - SIZE F/SMD - 8X10.2 (CAPACITOR  -  ALUMINIUM - SIZE F / EEEFK - SMD)
pins: 1, 2
text: +